# Altium schematic symbol library Regulator_Linear.SchLib: 1452 symbols (part 7 of 10)
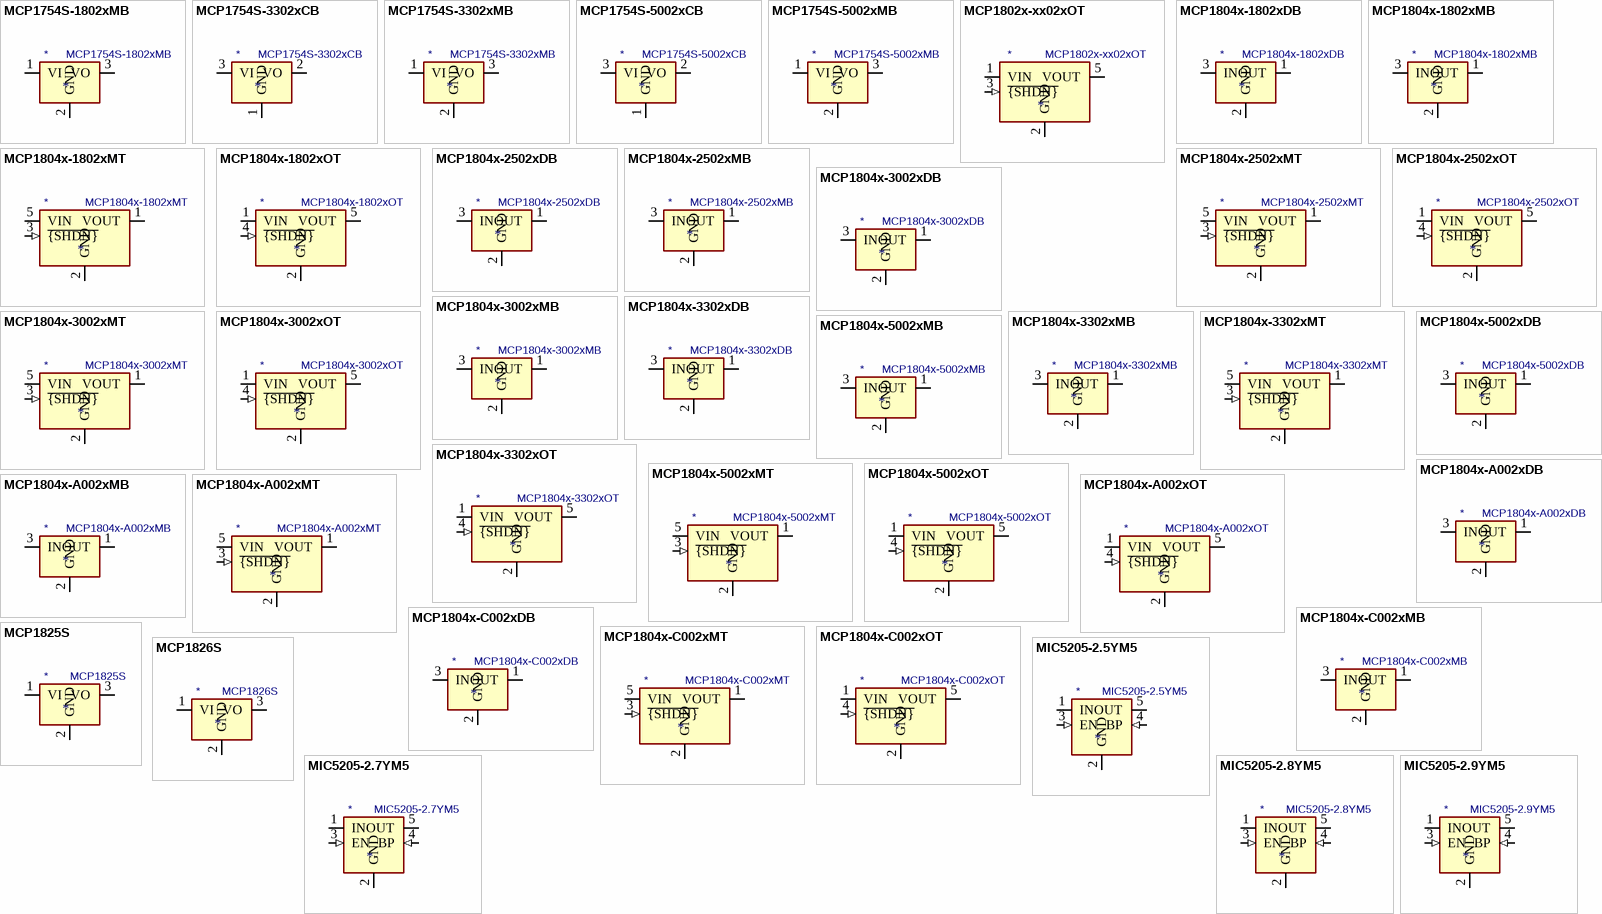
[diagram p42: symbols MCP1754S-1802xMB to MIC5205-2.9YM5]

## MCP1804x-5002xMT
designator *  value MCP1804x-5002xMT
ki_keywords: linear regulator ldo fixed positive; ki_description: 150mA, 28V LDO Regulator With Shutdown, 5.0V Fixed Output, SOT-89-5; ki_fp_filters: SOT?89*; Footprint: Package_TO_SOT_SMD:SOT-89-5; Supplier: http://ww1.microchip.com/downloads/en/DeviceDoc/20002200D.pdf
footprint SOT-89-5
pins: 1 VOUT (power), 2 GND (power), 3 ~{{SHDN}} (in), 4 NC (in) hidden, 5 VIN (power)

## MCP1804x-5002xOT
designator *  value MCP1804x-5002xOT
ki_keywords: linear regulator ldo fixed positive; ki_description: 150mA, 28V LDO Regulator With Shutdown, 5.0V Fixed Output, SOT-23-5; ki_fp_filters: SOT?23*; Footprint: Package_TO_SOT_SMD:SOT-23-5; Supplier: http://ww1.microchip.com/downloads/en/DeviceDoc/20002200D.pdf
footprint SOT-23-5
pins: 1 VIN (power), 2 GND (power), 3 NC (in) hidden, 4 ~{{SHDN}} (in), 5 VOUT (power)

## MCP1804x-A002xDB
designator *  value MCP1804x-A002xDB
ki_keywords: linear regulator ldo fixed positive; ki_description: 150mA, 28V LDO Regulator With Shutdown, 10.0V Fixed Output, SOT-223; ki_fp_filters: SOT?223*; Footprint: Package_TO_SOT_SMD:SOT-223-3_TabPin2; Supplier: http://ww1.microchip.com/downloads/en/DeviceDoc/20002200D.pdf
footprint SOT-223-3_TabPin2
pins: 1 OUT (power), 2 GND (power), 3 IN (power)

## MCP1804x-A002xMB
designator *  value MCP1804x-A002xMB
ki_keywords: linear regulator ldo fixed positive; ki_description: 150mA, 28V LDO Regulator With Shutdown, 10.0V Fixed Output, SOT-89-3; ki_fp_filters: SOT?89*; Footprint: Package_TO_SOT_SMD:SOT-89-3; Supplier: http://ww1.microchip.com/downloads/en/DeviceDoc/20002200D.pdf
footprint SOT-89-3
pins: 1 OUT (power), 2 GND (power), 3 IN (power)

## MCP1804x-A002xMT
designator *  value MCP1804x-A002xMT
ki_keywords: linear regulator ldo fixed positive; ki_description: 150mA, 28V LDO Regulator With Shutdown, 10.0V Fixed Output, SOT-89-5; ki_fp_filters: SOT?89*; Footprint: Package_TO_SOT_SMD:SOT-89-5; Supplier: http://ww1.microchip.com/downloads/en/DeviceDoc/20002200D.pdf
footprint SOT-89-5
pins: 1 VOUT (power), 2 GND (power), 3 ~{{SHDN}} (in), 4 NC (in) hidden, 5 VIN (power)

## MCP1804x-A002xOT
designator *  value MCP1804x-A002xOT
ki_keywords: linear regulator ldo fixed positive; ki_description: 150mA, 28V LDO Regulator With Shutdown, 10.0V Fixed Output, SOT-23-5; ki_fp_filters: SOT?23*; Footprint: Package_TO_SOT_SMD:SOT-23-5; Supplier: http://ww1.microchip.com/downloads/en/DeviceDoc/20002200D.pdf
footprint SOT-23-5
pins: 1 VIN (power), 2 GND (power), 3 NC (in) hidden, 4 ~{{SHDN}} (in), 5 VOUT (power)

## MCP1804x-C002xDB
designator *  value MCP1804x-C002xDB
ki_keywords: linear regulator ldo fixed positive; ki_description: 150mA, 28V LDO Regulator With Shutdown, 12.0V Fixed Output, SOT-223; ki_fp_filters: SOT?223*; Footprint: Package_TO_SOT_SMD:SOT-223-3_TabPin2; Supplier: http://ww1.microchip.com/downloads/en/DeviceDoc/20002200D.pdf
footprint SOT-223-3_TabPin2
pins: 1 OUT (power), 2 GND (power), 3 IN (power)

## MCP1804x-C002xMB
designator *  value MCP1804x-C002xMB
ki_keywords: linear regulator ldo fixed positive; ki_description: 150mA, 28V LDO Regulator With Shutdown, 12.0V Fixed Output, SOT-89-3; ki_fp_filters: SOT?89*; Footprint: Package_TO_SOT_SMD:SOT-89-3; Supplier: http://ww1.microchip.com/downloads/en/DeviceDoc/20002200D.pdf
footprint SOT-89-3
pins: 1 OUT (power), 2 GND (power), 3 IN (power)

## MCP1804x-C002xMT
designator *  value MCP1804x-C002xMT
ki_keywords: linear regulator ldo fixed positive; ki_description: 150mA, 28V LDO Regulator With Shutdown, 12.0V Fixed Output, SOT-89-5; ki_fp_filters: SOT?89*; Footprint: Package_TO_SOT_SMD:SOT-89-5; Supplier: http://ww1.microchip.com/downloads/en/DeviceDoc/20002200D.pdf
footprint SOT-89-5
pins: 1 VOUT (power), 2 GND (power), 3 ~{{SHDN}} (in), 4 NC (in) hidden, 5 VIN (power)

## MCP1804x-C002xOT
designator *  value MCP1804x-C002xOT
ki_keywords: linear regulator ldo fixed positive; ki_description: 150mA, 28V LDO Regulator With Shutdown, 12.0V Fixed Output, SOT-23-5; ki_fp_filters: SOT?23*; Footprint: Package_TO_SOT_SMD:SOT-23-5; Supplier: http://ww1.microchip.com/downloads/en/DeviceDoc/20002200D.pdf
footprint SOT-23-5
pins: 1 VIN (power), 2 GND (power), 3 NC (in) hidden, 4 ~{{SHDN}} (in), 5 VOUT (power)

## MCP1825S
designator *  value MCP1825S
ki_keywords: regulator linear ldo; ki_description: 500mA, Low-Voltage, Low Quiescent Current LDO Regulator, SOT-223, TO-220, TO-263; ki_fp_filters: SOT?223*TabPin2* TO?220* TO?263*; Supplier: http://ww1.microchip.com/downloads/en/devicedoc/22056b.pdf
pins: 1 VI (power), 2 GND (power), 3 VO (power)

## MCP1826S
designator *  value MCP1826S
ki_keywords: regulator linear ldo; ki_description: 1000mA, Low-Voltage, Low Quiescent Current LDO Regulator, SOT-223, TO-220, TO-263; ki_fp_filters: SOT?223*TabPin2* TO?220* TO?263*; Supplier: http://ww1.microchip.com/downloads/en/DeviceDoc/22057B.pdf
pins: 1 VI (power), 2 GND (power), 3 VO (power)

## MIC5205-2.5YM5
designator *  value MIC5205-2.5YM5
ki_keywords: 150mA low-noise LDO linear voltage regulator fixed positive; ki_description: 150mA low dropout linear regulator, fixed 2.5V output, SOT-23-5; ki_fp_filters: SOT?23*; Footprint: Package_TO_SOT_SMD:SOT-23-5; Supplier: http://ww1.microchip.com/downloads/en/DeviceDoc/20005785A.pdf
footprint SOT-23-5
pins: 1 IN (power), 2 GND (power), 3 EN (in), 4 BP (in), 5 OUT (power)

## MIC5205-2.7YM5
designator *  value MIC5205-2.7YM5
ki_keywords: 150mA low-noise LDO linear voltage regulator fixed positive; ki_description: 150mA low dropout linear regulator, fixed 2.7V output, SOT-23-5; ki_fp_filters: SOT?23*; Footprint: Package_TO_SOT_SMD:SOT-23-5; Supplier: http://ww1.microchip.com/downloads/en/DeviceDoc/20005785A.pdf
footprint SOT-23-5
pins: 1 IN (power), 2 GND (power), 3 EN (in), 4 BP (in), 5 OUT (power)

## MIC5205-2.8YM5
designator *  value MIC5205-2.8YM5
ki_keywords: 150mA low-noise LDO linear voltage regulator fixed positive; ki_description: 150mA low dropout linear regulator, fixed 2.8V output, SOT-23-5; ki_fp_filters: SOT?23*; Footprint: Package_TO_SOT_SMD:SOT-23-5; Supplier: http://ww1.microchip.com/downloads/en/DeviceDoc/20005785A.pdf
footprint SOT-23-5
pins: 1 IN (power), 2 GND (power), 3 EN (in), 4 BP (in), 5 OUT (power)

## MIC5205-2.9YM5
designator *  value MIC5205-2.9YM5
ki_keywords: 150mA low-noise LDO linear voltage regulator fixed positive; ki_description: 150mA low dropout linear regulator, fixed 2.9V output, SOT-23-5; ki_fp_filters: SOT?23*; Footprint: Package_TO_SOT_SMD:SOT-23-5; Supplier: http://ww1.microchip.com/downloads/en/DeviceDoc/20005785A.pdf
footprint SOT-23-5
pins: 1 IN (power), 2 GND (power), 3 EN (in), 4 BP (in), 5 OUT (power)

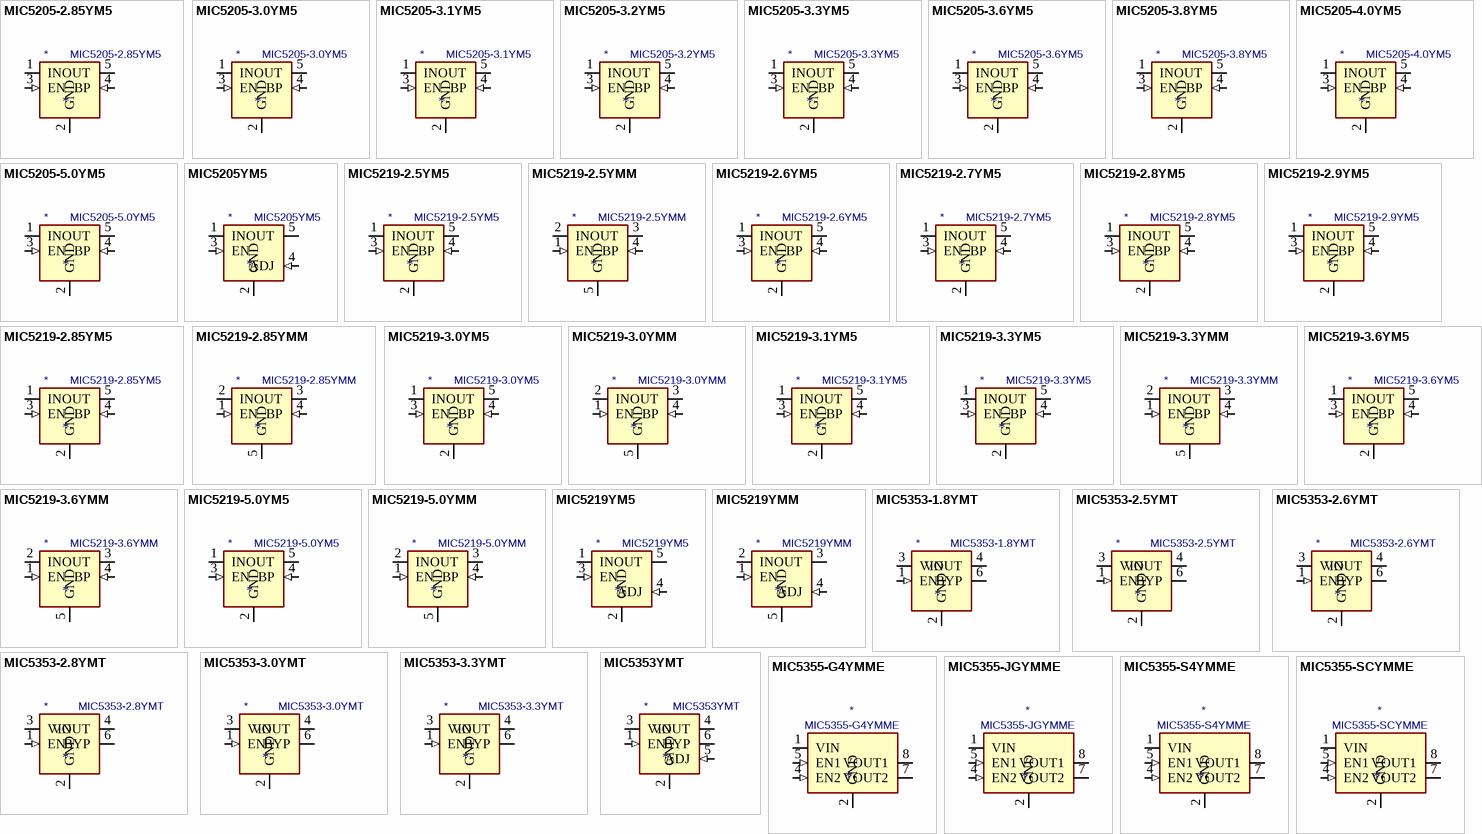
[diagram p24: symbols MIC5205-2.85YM5 to MIC5355-SCYMME]

## MIC5205-2.85YM5
designator *  value MIC5205-2.85YM5
ki_keywords: 150mA low-noise LDO linear voltage regulator fixed positive; ki_description: 150mA low dropout linear regulator, fixed 2.85V output, SOT-23-5; ki_fp_filters: SOT?23*; Footprint: Package_TO_SOT_SMD:SOT-23-5; Supplier: http://ww1.microchip.com/downloads/en/DeviceDoc/20005785A.pdf
footprint SOT-23-5
pins: 1 IN (power), 2 GND (power), 3 EN (in), 4 BP (in), 5 OUT (power)

## MIC5205-3.0YM5
designator *  value MIC5205-3.0YM5
ki_keywords: 150mA low-noise LDO linear voltage regulator fixed positive; ki_description: 150mA low dropout linear regulator, fixed 3.0V output, SOT-23-5; ki_fp_filters: SOT?23*; Footprint: Package_TO_SOT_SMD:SOT-23-5; Supplier: http://ww1.microchip.com/downloads/en/DeviceDoc/20005785A.pdf
footprint SOT-23-5
pins: 1 IN (power), 2 GND (power), 3 EN (in), 4 BP (in), 5 OUT (power)

## MIC5205-3.1YM5
designator *  value MIC5205-3.1YM5
ki_keywords: 150mA low-noise LDO linear voltage regulator fixed positive; ki_description: 150mA low dropout linear regulator, fixed 3.1V output, SOT-23-5; ki_fp_filters: SOT?23*; Footprint: Package_TO_SOT_SMD:SOT-23-5; Supplier: http://ww1.microchip.com/downloads/en/DeviceDoc/20005785A.pdf
footprint SOT-23-5
pins: 1 IN (power), 2 GND (power), 3 EN (in), 4 BP (in), 5 OUT (power)

## MIC5205-3.2YM5
designator *  value MIC5205-3.2YM5
ki_keywords: 150mA low-noise LDO linear voltage regulator fixed positive; ki_description: 150mA low dropout linear regulator, fixed 3.2V output, SOT-23-5; ki_fp_filters: SOT?23*; Footprint: Package_TO_SOT_SMD:SOT-23-5; Supplier: http://ww1.microchip.com/downloads/en/DeviceDoc/20005785A.pdf
footprint SOT-23-5
pins: 1 IN (power), 2 GND (power), 3 EN (in), 4 BP (in), 5 OUT (power)

## MIC5205-3.3YM5
designator *  value MIC5205-3.3YM5
ki_keywords: 150mA low-noise LDO linear voltage regulator fixed positive; ki_description: 150mA low dropout linear regulator, fixed 3.3V output, SOT-23-5; ki_fp_filters: SOT?23*; Footprint: Package_TO_SOT_SMD:SOT-23-5; Supplier: http://ww1.microchip.com/downloads/en/DeviceDoc/20005785A.pdf
footprint SOT-23-5
pins: 1 IN (power), 2 GND (power), 3 EN (in), 4 BP (in), 5 OUT (power)

## MIC5205-3.6YM5
designator *  value MIC5205-3.6YM5
ki_keywords: 150mA low-noise LDO linear voltage regulator fixed positive; ki_description: 150mA low dropout linear regulator, fixed 3.6V output, SOT-23-5; ki_fp_filters: SOT?23*; Footprint: Package_TO_SOT_SMD:SOT-23-5; Supplier: http://ww1.microchip.com/downloads/en/DeviceDoc/20005785A.pdf
footprint SOT-23-5
pins: 1 IN (power), 2 GND (power), 3 EN (in), 4 BP (in), 5 OUT (power)

## MIC5205-3.8YM5
designator *  value MIC5205-3.8YM5
ki_keywords: 150mA low-noise LDO linear voltage regulator fixed positive; ki_description: 150mA low dropout linear regulator, fixed 3.8V output, SOT-23-5; ki_fp_filters: SOT?23*; Footprint: Package_TO_SOT_SMD:SOT-23-5; Supplier: http://ww1.microchip.com/downloads/en/DeviceDoc/20005785A.pdf
footprint SOT-23-5
pins: 1 IN (power), 2 GND (power), 3 EN (in), 4 BP (in), 5 OUT (power)

## MIC5205-4.0YM5
designator *  value MIC5205-4.0YM5
ki_keywords: 150mA low-noise LDO linear voltage regulator fixed positive; ki_description: 150mA low dropout linear regulator, fixed 4.0V output, SOT-23-5; ki_fp_filters: SOT?23*; Footprint: Package_TO_SOT_SMD:SOT-23-5; Supplier: http://ww1.microchip.com/downloads/en/DeviceDoc/20005785A.pdf
footprint SOT-23-5
pins: 1 IN (power), 2 GND (power), 3 EN (in), 4 BP (in), 5 OUT (power)

## MIC5205-5.0YM5
designator *  value MIC5205-5.0YM5
ki_keywords: 150mA low-noise LDO linear voltage regulator fixed positive; ki_description: 150mA low dropout linear regulator, fixed 5.0V output, SOT-23-5; ki_fp_filters: SOT?23*; Footprint: Package_TO_SOT_SMD:SOT-23-5; Supplier: http://ww1.microchip.com/downloads/en/DeviceDoc/20005785A.pdf
footprint SOT-23-5
pins: 1 IN (power), 2 GND (power), 3 EN (in), 4 BP (in), 5 OUT (power)

## MIC5205YM5
designator *  value MIC5205YM5
ki_keywords: 150mA low-noise LDO linear voltage regulator adjustable positive; ki_description: 150mA low dropout linear regulator, adjustable output, SOT-23-5; ki_fp_filters: SOT?23*; Footprint: Package_TO_SOT_SMD:SOT-23-5; Supplier: http://ww1.microchip.com/downloads/en/DeviceDoc/20005785A.pdf
footprint SOT-23-5
pins: 1 IN (power), 2 GND (power), 3 EN (in), 4 ADJ (in), 5 OUT (power)

## MIC5219-2.5YM5
designator *  value MIC5219-2.5YM5
ki_keywords: 500mA ultra-low-noise LDO linear voltage regulator fixed positive; ki_description: 500mA low dropout linear regulator, fixed 2.5V output, SOT-23-5; ki_fp_filters: SOT?23*; Footprint: Package_TO_SOT_SMD:SOT-23-5; Supplier: http://ww1.microchip.com/downloads/en/DeviceDoc/MIC5219-500mA-Peak-Output-LDO-Regulator-DS20006021A.pdf
footprint SOT-23-5
pins: 1 IN (power), 2 GND (power), 3 EN (in), 4 BP (in), 5 OUT (power)

## MIC5219-2.5YMM
designator *  value MIC5219-2.5YMM
ki_keywords: 500mA ultra-low-noise LDO linear voltage regulator fixed positive; ki_description: 500mA low dropout linear regulator, fixed 2.5V output, MSOP-8; ki_fp_filters: MSOP*3x3mm*P0.65mm*; Footprint: Package_SO:MSOP-8_3x3mm_P0.65mm; Supplier: http://ww1.microchip.com/downloads/en/DeviceDoc/MIC5219-500mA-Peak-Output-LDO-Regulator-DS20006021A.pdf
footprint MSOP-8_3x3mm_P0.65mm
pins: 1 EN (in), 2 IN (power), 3 OUT (power), 4 BP (in), 5 GND (power), 6 GND hidden, 7 GND hidden, 8 GND hidden

## MIC5219-2.6YM5
designator *  value MIC5219-2.6YM5
ki_keywords: 500mA ultra-low-noise LDO linear voltage regulator fixed positive; ki_description: 500mA low dropout linear regulator, fixed 2.6V output, SOT-23-5; ki_fp_filters: SOT?23*; Footprint: Package_TO_SOT_SMD:SOT-23-5; Supplier: http://ww1.microchip.com/downloads/en/DeviceDoc/MIC5219-500mA-Peak-Output-LDO-Regulator-DS20006021A.pdf
footprint SOT-23-5
pins: 1 IN (power), 2 GND (power), 3 EN (in), 4 BP (in), 5 OUT (power)

## MIC5219-2.7YM5
designator *  value MIC5219-2.7YM5
ki_keywords: 500mA ultra-low-noise LDO linear voltage regulator fixed positive; ki_description: 500mA low dropout linear regulator, fixed 2.7V output, SOT-23-5; ki_fp_filters: SOT?23*; Footprint: Package_TO_SOT_SMD:SOT-23-5; Supplier: http://ww1.microchip.com/downloads/en/DeviceDoc/MIC5219-500mA-Peak-Output-LDO-Regulator-DS20006021A.pdf
footprint SOT-23-5
pins: 1 IN (power), 2 GND (power), 3 EN (in), 4 BP (in), 5 OUT (power)

## MIC5219-2.8YM5
designator *  value MIC5219-2.8YM5
ki_keywords: 500mA ultra-low-noise LDO linear voltage regulator fixed positive; ki_description: 500mA low dropout linear regulator, fixed 2.8V output, SOT-23-5; ki_fp_filters: SOT?23*; Footprint: Package_TO_SOT_SMD:SOT-23-5; Supplier: http://ww1.microchip.com/downloads/en/DeviceDoc/MIC5219-500mA-Peak-Output-LDO-Regulator-DS20006021A.pdf
footprint SOT-23-5
pins: 1 IN (power), 2 GND (power), 3 EN (in), 4 BP (in), 5 OUT (power)

## MIC5219-2.9YM5
designator *  value MIC5219-2.9YM5
ki_keywords: 500mA ultra-low-noise LDO linear voltage regulator fixed positive; ki_description: 500mA low dropout linear regulator, fixed 2.9V output, SOT-23-5; ki_fp_filters: SOT?23*; Footprint: Package_TO_SOT_SMD:SOT-23-5; Supplier: http://ww1.microchip.com/downloads/en/DeviceDoc/MIC5219-500mA-Peak-Output-LDO-Regulator-DS20006021A.pdf
footprint SOT-23-5
pins: 1 IN (power), 2 GND (power), 3 EN (in), 4 BP (in), 5 OUT (power)

## MIC5219-2.85YM5
designator *  value MIC5219-2.85YM5
ki_keywords: 500mA ultra-low-noise LDO linear voltage regulator fixed positive; ki_description: 500mA low dropout linear regulator, fixed 2.85V output, SOT-23-5; ki_fp_filters: SOT?23*; Footprint: Package_TO_SOT_SMD:SOT-23-5; Supplier: http://ww1.microchip.com/downloads/en/DeviceDoc/MIC5219-500mA-Peak-Output-LDO-Regulator-DS20006021A.pdf
footprint SOT-23-5
pins: 1 IN (power), 2 GND (power), 3 EN (in), 4 BP (in), 5 OUT (power)

## MIC5219-2.85YMM
designator *  value MIC5219-2.85YMM
ki_keywords: 500mA ultra-low-noise LDO linear voltage regulator fixed positive; ki_description: 500mA low dropout linear regulator, fixed 2.85V output, MSOP-8; ki_fp_filters: MSOP*3x3mm*P0.65mm*; Footprint: Package_SO:MSOP-8_3x3mm_P0.65mm; Supplier: http://ww1.microchip.com/downloads/en/DeviceDoc/MIC5219-500mA-Peak-Output-LDO-Regulator-DS20006021A.pdf
footprint MSOP-8_3x3mm_P0.65mm
pins: 1 EN (in), 2 IN (power), 3 OUT (power), 4 BP (in), 5 GND (power), 6 GND hidden, 7 GND hidden, 8 GND hidden

## MIC5219-3.0YM5
designator *  value MIC5219-3.0YM5
ki_keywords: 500mA ultra-low-noise LDO linear voltage regulator fixed positive; ki_description: 500mA low dropout linear regulator, fixed 3.0V output, SOT-23-5; ki_fp_filters: SOT?23*; Footprint: Package_TO_SOT_SMD:SOT-23-5; Supplier: http://ww1.microchip.com/downloads/en/DeviceDoc/MIC5219-500mA-Peak-Output-LDO-Regulator-DS20006021A.pdf
footprint SOT-23-5
pins: 1 IN (power), 2 GND (power), 3 EN (in), 4 BP (in), 5 OUT (power)

## MIC5219-3.0YMM
designator *  value MIC5219-3.0YMM
ki_keywords: 500mA ultra-low-noise LDO linear voltage regulator fixed positive; ki_description: 500mA low dropout linear regulator, fixed 3.0V output, MSOP-8; ki_fp_filters: MSOP*3x3mm*P0.65mm*; Footprint: Package_SO:MSOP-8_3x3mm_P0.65mm; Supplier: http://ww1.microchip.com/downloads/en/DeviceDoc/MIC5219-500mA-Peak-Output-LDO-Regulator-DS20006021A.pdf
footprint MSOP-8_3x3mm_P0.65mm
pins: 1 EN (in), 2 IN (power), 3 OUT (power), 4 BP (in), 5 GND (power), 6 GND hidden, 7 GND hidden, 8 GND hidden

## MIC5219-3.1YM5
designator *  value MIC5219-3.1YM5
ki_keywords: 500mA ultra-low-noise LDO linear voltage regulator fixed positive; ki_description: 500mA low dropout linear regulator, fixed 3.1V output, SOT-23-5; ki_fp_filters: SOT?23*; Footprint: Package_TO_SOT_SMD:SOT-23-5; Supplier: http://ww1.microchip.com/downloads/en/DeviceDoc/MIC5219-500mA-Peak-Output-LDO-Regulator-DS20006021A.pdf
footprint SOT-23-5
pins: 1 IN (power), 2 GND (power), 3 EN (in), 4 BP (in), 5 OUT (power)

## MIC5219-3.3YM5
designator *  value MIC5219-3.3YM5
ki_keywords: 500mA ultra-low-noise LDO linear voltage regulator fixed positive; ki_description: 500mA low dropout linear regulator, fixed 3.3V output, SOT-23-5; ki_fp_filters: SOT?23*; Footprint: Package_TO_SOT_SMD:SOT-23-5; Supplier: http://ww1.microchip.com/downloads/en/DeviceDoc/MIC5219-500mA-Peak-Output-LDO-Regulator-DS20006021A.pdf
footprint SOT-23-5
pins: 1 IN (power), 2 GND (power), 3 EN (in), 4 BP (in), 5 OUT (power)

## MIC5219-3.3YMM
designator *  value MIC5219-3.3YMM
ki_keywords: 500mA ultra-low-noise LDO linear voltage regulator fixed positive; ki_description: 500mA low dropout linear regulator, fixed 3.3V output, MSOP-8; ki_fp_filters: MSOP*3x3mm*P0.65mm*; Footprint: Package_SO:MSOP-8_3x3mm_P0.65mm; Supplier: http://ww1.microchip.com/downloads/en/DeviceDoc/MIC5219-500mA-Peak-Output-LDO-Regulator-DS20006021A.pdf
footprint MSOP-8_3x3mm_P0.65mm
pins: 1 EN (in), 2 IN (power), 3 OUT (power), 4 BP (in), 5 GND (power), 6 GND hidden, 7 GND hidden, 8 GND hidden

## MIC5219-3.6YM5
designator *  value MIC5219-3.6YM5
ki_keywords: 500mA ultra-low-noise LDO linear voltage regulator fixed positive; ki_description: 500mA low dropout linear regulator, fixed 3.6V output, SOT-23-5; ki_fp_filters: SOT?23*; Footprint: Package_TO_SOT_SMD:SOT-23-5; Supplier: http://ww1.microchip.com/downloads/en/DeviceDoc/MIC5219-500mA-Peak-Output-LDO-Regulator-DS20006021A.pdf
footprint SOT-23-5
pins: 1 IN (power), 2 GND (power), 3 EN (in), 4 BP (in), 5 OUT (power)

## MIC5219-3.6YMM
designator *  value MIC5219-3.6YMM
ki_keywords: 500mA ultra-low-noise LDO linear voltage regulator fixed positive; ki_description: 500mA low dropout linear regulator, fixed 3.6V output, MSOP-8; ki_fp_filters: MSOP*3x3mm*P0.65mm*; Footprint: Package_SO:MSOP-8_3x3mm_P0.65mm; Supplier: http://ww1.microchip.com/downloads/en/DeviceDoc/MIC5219-500mA-Peak-Output-LDO-Regulator-DS20006021A.pdf
footprint MSOP-8_3x3mm_P0.65mm
pins: 1 EN (in), 2 IN (power), 3 OUT (power), 4 BP (in), 5 GND (power), 6 GND hidden, 7 GND hidden, 8 GND hidden

## MIC5219-5.0YM5
designator *  value MIC5219-5.0YM5
ki_keywords: 500mA ultra-low-noise LDO linear voltage regulator fixed positive; ki_description: 500mA low dropout linear regulator, fixed 5.0V output, SOT-23-5; ki_fp_filters: SOT?23*; Footprint: Package_TO_SOT_SMD:SOT-23-5; Supplier: http://ww1.microchip.com/downloads/en/DeviceDoc/MIC5219-500mA-Peak-Output-LDO-Regulator-DS20006021A.pdf
footprint SOT-23-5
pins: 1 IN (power), 2 GND (power), 3 EN (in), 4 BP (in), 5 OUT (power)

## MIC5219-5.0YMM
designator *  value MIC5219-5.0YMM
ki_keywords: 500mA ultra-low-noise LDO linear voltage regulator fixed positive; ki_description: 500mA low dropout linear regulator, fixed 5.0V output, MSOP-8; ki_fp_filters: MSOP*3x3mm*P0.65mm*; Footprint: Package_SO:MSOP-8_3x3mm_P0.65mm; Supplier: http://ww1.microchip.com/downloads/en/DeviceDoc/MIC5219-500mA-Peak-Output-LDO-Regulator-DS20006021A.pdf
footprint MSOP-8_3x3mm_P0.65mm
pins: 1 EN (in), 2 IN (power), 3 OUT (power), 4 BP (in), 5 GND (power), 6 GND hidden, 7 GND hidden, 8 GND hidden

## MIC5219YM5
designator *  value MIC5219YM5
ki_keywords: 500mA ultra-low-noise LDO linear voltage regulator adjustable positive; ki_description: 500mA low dropout linear regulator, adjustable output, SOT-23-5; ki_fp_filters: SOT?23*; Footprint: Package_TO_SOT_SMD:SOT-23-5; Supplier: http://ww1.microchip.com/downloads/en/DeviceDoc/MIC5219-500mA-Peak-Output-LDO-Regulator-DS20006021A.pdf
footprint SOT-23-5
pins: 1 IN (power), 2 GND (power), 3 EN (in), 4 ADJ (in), 5 OUT (power)

## MIC5219YMM
designator *  value MIC5219YMM
ki_keywords: 500mA ultra-low-noise LDO linear voltage regulator adjustable positive; ki_description: 500mA low dropout linear regulator, adjustable output, MSOP-8; ki_fp_filters: MSOP*3x3mm*P0.65mm*; Footprint: Package_SO:MSOP-8_3x3mm_P0.65mm; Supplier: http://ww1.microchip.com/downloads/en/DeviceDoc/MIC5219-500mA-Peak-Output-LDO-Regulator-DS20006021A.pdf
footprint MSOP-8_3x3mm_P0.65mm
pins: 1 EN (in), 2 IN (power), 3 OUT (power), 4 ADJ (in), 5 GND (power), 6 GND hidden, 7 GND hidden, 8 GND hidden

## MIC5353-1.8YMT
designator *  value MIC5353-1.8YMT
ki_keywords: Single LDO; ki_description: High-performance, single-output,  ultra-low  LDO regulator; ki_fp_filters: MLF?6?1EP*1.6x1.6mm*P0.5mm*; Footprint: Package_DFN_QFN:MLF-6-1EP_1.6x1.6mm_P0.5mm_EP0.5x1.26mm; Supplier: http://ww1.microchip.com/downloads/en/DeviceDoc/mic5353.pdf
footprint MLF-6-1EP_1.6x1.6mm_P0.5mm_EP0.5x1.26mm
pins: 1 EN (in), 2 GND (power), 3 VIN (power), 4 VOUT (power), 5 NC (in) hidden, 6 BYP, 7 GND hidden

## MIC5353-2.5YMT
designator *  value MIC5353-2.5YMT
ki_keywords: Single LDO; ki_description: High-performance, single-output,  ultra-low  LDO regulator; ki_fp_filters: MLF?6?1EP*1.6x1.6mm*P0.5mm*; Footprint: Package_DFN_QFN:MLF-6-1EP_1.6x1.6mm_P0.5mm_EP0.5x1.26mm; Supplier: http://ww1.microchip.com/downloads/en/DeviceDoc/mic5353.pdf
footprint MLF-6-1EP_1.6x1.6mm_P0.5mm_EP0.5x1.26mm
pins: 1 EN (in), 2 GND (power), 3 VIN (power), 4 VOUT (power), 5 NC (in) hidden, 6 BYP, 7 GND hidden

## MIC5353-2.6YMT
designator *  value MIC5353-2.6YMT
ki_keywords: Single LDO; ki_description: High-performance, single-output,  ultra-low  LDO regulator; ki_fp_filters: MLF?6?1EP*1.6x1.6mm*P0.5mm*; Footprint: Package_DFN_QFN:MLF-6-1EP_1.6x1.6mm_P0.5mm_EP0.5x1.26mm; Supplier: http://ww1.microchip.com/downloads/en/DeviceDoc/mic5353.pdf
footprint MLF-6-1EP_1.6x1.6mm_P0.5mm_EP0.5x1.26mm
pins: 1 EN (in), 2 GND (power), 3 VIN (power), 4 VOUT (power), 5 NC (in) hidden, 6 BYP, 7 GND hidden

## MIC5353-2.8YMT
designator *  value MIC5353-2.8YMT
ki_keywords: Single LDO; ki_description: High-performance, single-output,  ultra-low  LDO regulator; ki_fp_filters: MLF?6?1EP*1.6x1.6mm*P0.5mm*; Footprint: Package_DFN_QFN:MLF-6-1EP_1.6x1.6mm_P0.5mm_EP0.5x1.26mm; Supplier: http://ww1.microchip.com/downloads/en/DeviceDoc/mic5353.pdf
footprint MLF-6-1EP_1.6x1.6mm_P0.5mm_EP0.5x1.26mm
pins: 1 EN (in), 2 GND (power), 3 VIN (power), 4 VOUT (power), 5 NC (in) hidden, 6 BYP, 7 GND hidden

## MIC5353-3.0YMT
designator *  value MIC5353-3.0YMT
ki_keywords: Single LDO; ki_description: High-performance, single-output,  ultra-low  LDO regulator; ki_fp_filters: MLF?6?1EP*1.6x1.6mm*P0.5mm*; Footprint: Package_DFN_QFN:MLF-6-1EP_1.6x1.6mm_P0.5mm_EP0.5x1.26mm; Supplier: http://ww1.microchip.com/downloads/en/DeviceDoc/mic5353.pdf
footprint MLF-6-1EP_1.6x1.6mm_P0.5mm_EP0.5x1.26mm
pins: 1 EN (in), 2 GND (power), 3 VIN (power), 4 VOUT (power), 5 NC (in) hidden, 6 BYP, 7 GND hidden

## MIC5353-3.3YMT
designator *  value MIC5353-3.3YMT
ki_keywords: Single LDO; ki_description: High-performance, single-output,  ultra-low  LDO regulator; ki_fp_filters: MLF?6?1EP*1.6x1.6mm*P0.5mm*; Footprint: Package_DFN_QFN:MLF-6-1EP_1.6x1.6mm_P0.5mm_EP0.5x1.26mm; Supplier: http://ww1.microchip.com/downloads/en/DeviceDoc/mic5353.pdf
footprint MLF-6-1EP_1.6x1.6mm_P0.5mm_EP0.5x1.26mm
pins: 1 EN (in), 2 GND (power), 3 VIN (power), 4 VOUT (power), 5 NC (in) hidden, 6 BYP, 7 GND hidden

## MIC5353YMT
designator *  value MIC5353YMT
ki_keywords: Single LDO; ki_description: High-performance, single-output,  ultra-low  LDO regulator; ki_fp_filters: MLF?6?1EP*1.6x1.6mm*P0.5mm*; Footprint: Package_DFN_QFN:MLF-6-1EP_1.6x1.6mm_P0.5mm_EP0.5x1.26mm; Supplier: http://ww1.microchip.com/downloads/en/DeviceDoc/mic5353.pdf
footprint MLF-6-1EP_1.6x1.6mm_P0.5mm_EP0.5x1.26mm
pins: 1 EN (in), 2 GND (power), 3 VIN (power), 4 VOUT (power), 5 ADJ (in), 6 BYP, 7 GND hidden

## MIC5355-G4YMME
designator *  value MIC5355-G4YMME
ki_keywords: Dual LDO 500mA MSOP-8; ki_description: Dual 500mA μCap Low Dropout Micropower Linear Regulator, 1.8V/1.2V, MSOP-8; ki_fp_filters: MSOP*1EP*3x3mm*P0.65mm*; Footprint: Package_SO:MSOP-8-1EP_3x3mm_P0.65mm_EP2.5x3mm_Mask1.73x2.36mm_ThermalVias; Supplier: http://ww1.microchip.com/downloads/en/DeviceDoc/mic5355_6.pdf
footprint MSOP-8-1EP_3x3mm_P0.65mm_EP2.5x3mm_Mask1.73x2.36mm_ThermalVias
pins: 1 VIN (power), 2 GND (power), 3 NC (in) hidden, 4 EN2 (in), 5 EN1 (in), 6 NC (in) hidden, 7 VOUT2 (power), 8 VOUT1 (power), 9 GND hidden

## MIC5355-JGYMME
designator *  value MIC5355-JGYMME
ki_keywords: Dual LDO 500mA MSOP-8; ki_description: Dual 500mA μCap Low Dropout Micropower Linear Regulator, 2.5V/1.8V, MSOP-8; ki_fp_filters: MSOP*1EP*3x3mm*P0.65mm*; Footprint: Package_SO:MSOP-8-1EP_3x3mm_P0.65mm_EP2.5x3mm_Mask1.73x2.36mm_ThermalVias; Supplier: http://ww1.microchip.com/downloads/en/DeviceDoc/mic5355_6.pdf
footprint MSOP-8-1EP_3x3mm_P0.65mm_EP2.5x3mm_Mask1.73x2.36mm_ThermalVias
pins: 1 VIN (power), 2 GND (power), 3 NC (in) hidden, 4 EN2 (in), 5 EN1 (in), 6 NC (in) hidden, 7 VOUT2 (power), 8 VOUT1 (power), 9 GND hidden

## MIC5355-S4YMME
designator *  value MIC5355-S4YMME
ki_keywords: Dual LDO 500mA MSOP-8; ki_description: Dual 500mA μCap Low Dropout Micropower Linear Regulator, 3.3V/1.2V, MSOP-8; ki_fp_filters: MSOP*1EP*3x3mm*P0.65mm*; Footprint: Package_SO:MSOP-8-1EP_3x3mm_P0.65mm_EP2.5x3mm_Mask1.73x2.36mm_ThermalVias; Supplier: http://ww1.microchip.com/downloads/en/DeviceDoc/mic5355_6.pdf
footprint MSOP-8-1EP_3x3mm_P0.65mm_EP2.5x3mm_Mask1.73x2.36mm_ThermalVias
pins: 1 VIN (power), 2 GND (power), 3 NC (in) hidden, 4 EN2 (in), 5 EN1 (in), 6 NC (in) hidden, 7 VOUT2 (power), 8 VOUT1 (power), 9 GND hidden

## MIC5355-SCYMME
designator *  value MIC5355-SCYMME
ki_keywords: Dual LDO 500mA MSOP-8; ki_description: Dual 500mA μCap Low Dropout Micropower Linear Regulator, 3.3V/1.0V, MSOP-8; ki_fp_filters: MSOP*1EP*3x3mm*P0.65mm*; Footprint: Package_SO:MSOP-8-1EP_3x3mm_P0.65mm_EP2.5x3mm_Mask1.73x2.36mm_ThermalVias; Supplier: http://ww1.microchip.com/downloads/en/DeviceDoc/mic5355_6.pdf
footprint MSOP-8-1EP_3x3mm_P0.65mm_EP2.5x3mm_Mask1.73x2.36mm_ThermalVias
pins: 1 VIN (power), 2 GND (power), 3 NC (in) hidden, 4 EN2 (in), 5 EN1 (in), 6 NC (in) hidden, 7 VOUT2 (power), 8 VOUT1 (power), 9 GND hidden

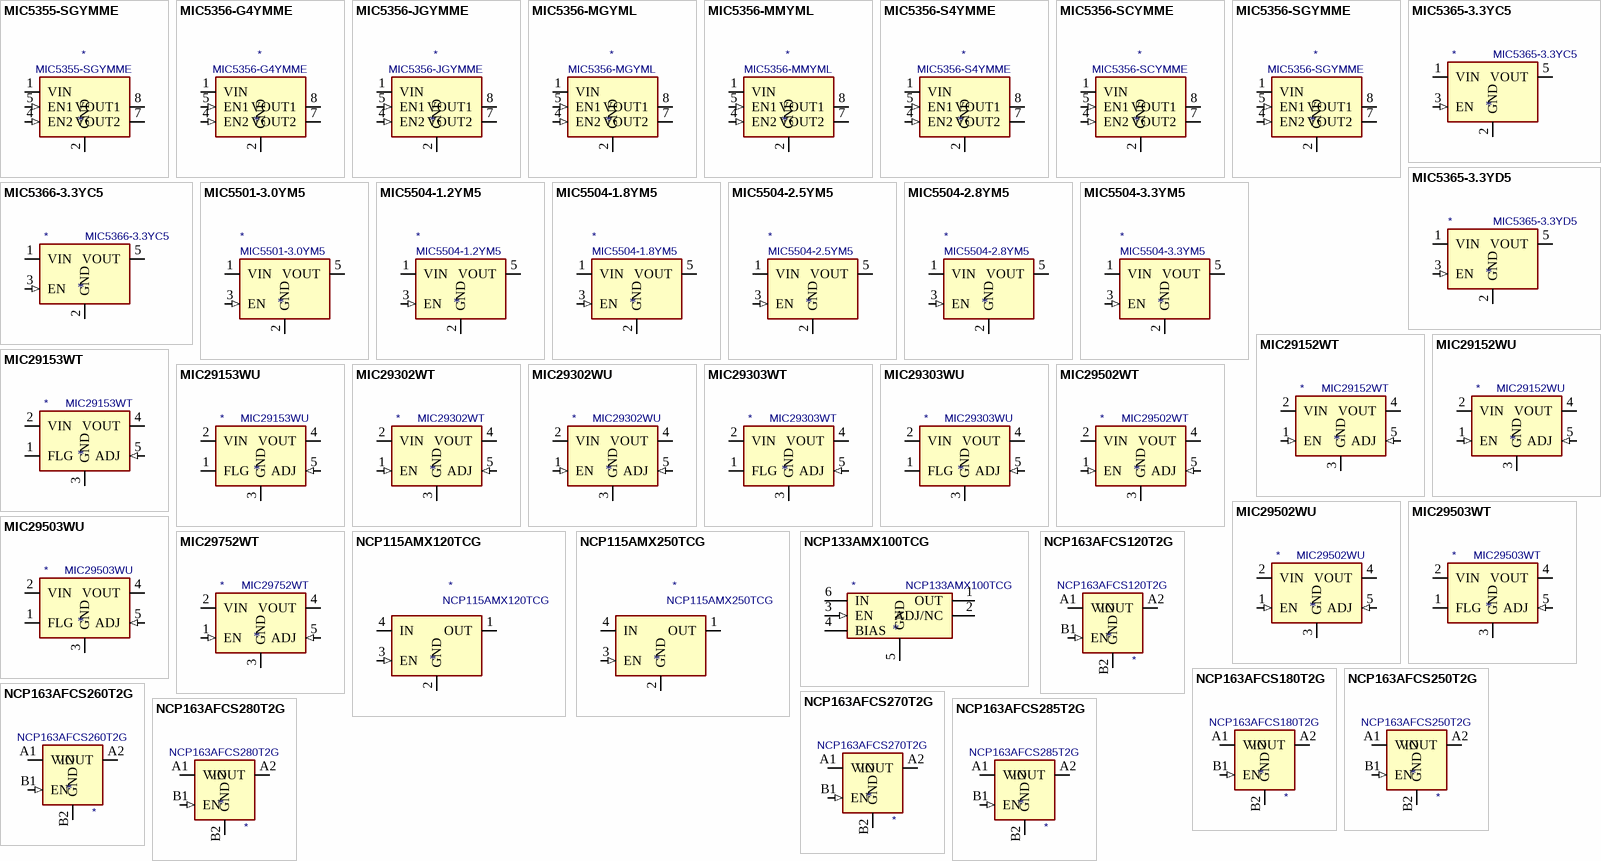
[diagram p25: symbols MIC5355-SGYMME to NCP163AFCS285T2G]

## MIC5355-SGYMME
designator *  value MIC5355-SGYMME
ki_keywords: Dual LDO 500mA MSOP-8; ki_description: Dual 500mA μCap Low Dropout Micropower Linear Regulator, 3.3V/1.8V, MSOP-8; ki_fp_filters: MSOP*1EP*3x3mm*P0.65mm*; Footprint: Package_SO:MSOP-8-1EP_3x3mm_P0.65mm_EP2.5x3mm_Mask1.73x2.36mm_ThermalVias; Supplier: http://ww1.microchip.com/downloads/en/DeviceDoc/mic5355_6.pdf
footprint MSOP-8-1EP_3x3mm_P0.65mm_EP2.5x3mm_Mask1.73x2.36mm_ThermalVias
pins: 1 VIN (power), 2 GND (power), 3 NC (in) hidden, 4 EN2 (in), 5 EN1 (in), 6 NC (in) hidden, 7 VOUT2 (power), 8 VOUT1 (power), 9 GND hidden

## MIC5356-G4YMME
designator *  value MIC5356-G4YMME
ki_keywords: Dual LDO 500mA MSOP-8; ki_description: Dual 500mA μCap Low Dropout Micropower Linear Regulator, 1.8V/1.2V, MSOP-8; ki_fp_filters: MSOP*1EP*3x3mm*P0.65mm*; Footprint: Package_SO:MSOP-8-1EP_3x3mm_P0.65mm_EP2.5x3mm_Mask1.73x2.36mm_ThermalVias; Supplier: http://ww1.microchip.com/downloads/en/DeviceDoc/mic5355_6.pdf
footprint MSOP-8-1EP_3x3mm_P0.65mm_EP2.5x3mm_Mask1.73x2.36mm_ThermalVias
pins: 1 VIN (power), 2 GND (power), 3 NC (in) hidden, 4 EN2 (in), 5 EN1 (in), 6 NC (in) hidden, 7 VOUT2 (power), 8 VOUT1 (power), 9 GND hidden

## MIC5356-JGYMME
designator *  value MIC5356-JGYMME
ki_keywords: Dual LDO 500mA MSOP-8; ki_description: Dual 500mA μCap Low Dropout Micropower Linear Regulator, 2.5V/1.8V, MSOP-8; ki_fp_filters: MSOP*1EP*3x3mm*P0.65mm*; Footprint: Package_SO:MSOP-8-1EP_3x3mm_P0.65mm_EP2.5x3mm_Mask1.73x2.36mm_ThermalVias; Supplier: http://ww1.microchip.com/downloads/en/DeviceDoc/mic5355_6.pdf
footprint MSOP-8-1EP_3x3mm_P0.65mm_EP2.5x3mm_Mask1.73x2.36mm_ThermalVias
pins: 1 VIN (power), 2 GND (power), 3 NC (in) hidden, 4 EN2 (in), 5 EN1 (in), 6 NC (in) hidden, 7 VOUT2 (power), 8 VOUT1 (power), 9 GND hidden

## MIC5356-MGYML
designator *  value MIC5356-MGYML
ki_keywords: Dual LDO 500mA DFN-8; ki_description: Dual 500mA μCap Low Dropout Micropower Linear Regulator, 2.8V/1.8V, DFN-8; ki_fp_filters: MLF*3x3mm*P0.65mm*EP1.55x2.3mm*; Footprint: Package_DFN_QFN:MLF-8-1EP_3x3mm_P0.65mm_EP1.55x2.3mm_ThermalVias; Supplier: http://ww1.microchip.com/downloads/en/DeviceDoc/mic5355_6.pdf
footprint MLF-8-1EP_3x3mm_P0.65mm_EP1.55x2.3mm_ThermalVias
pins: 1 VIN (power), 2 GND (power), 3 NC (in) hidden, 4 EN2 (in), 5 EN1 (in), 6 NC (in) hidden, 7 VOUT2 (power), 8 VOUT1 (power), 9 GND hidden

## MIC5356-MMYML
designator *  value MIC5356-MMYML
ki_keywords: Dual LDO 500mA DFN-8; ki_description: Dual 500mA μCap Low Dropout Micropower Linear Regulator, 2.8V/2.8V, DFN-8; ki_fp_filters: MLF*3x3mm*P0.65mm*EP1.55x2.3mm*; Footprint: Package_DFN_QFN:MLF-8-1EP_3x3mm_P0.65mm_EP1.55x2.3mm_ThermalVias; Supplier: http://ww1.microchip.com/downloads/en/DeviceDoc/mic5355_6.pdf
footprint MLF-8-1EP_3x3mm_P0.65mm_EP1.55x2.3mm_ThermalVias
pins: 1 VIN (power), 2 GND (power), 3 NC (in) hidden, 4 EN2 (in), 5 EN1 (in), 6 NC (in) hidden, 7 VOUT2 (power), 8 VOUT1 (power), 9 GND hidden

## MIC5356-S4YMME
designator *  value MIC5356-S4YMME
ki_keywords: Dual LDO 500mA MSOP-8; ki_description: Dual 500mA μCap Low Dropout Micropower Linear Regulator, 3.3V/1.2V, MSOP-8; ki_fp_filters: MSOP*1EP*3x3mm*P0.65mm*; Footprint: Package_SO:MSOP-8-1EP_3x3mm_P0.65mm_EP2.5x3mm_Mask1.73x2.36mm_ThermalVias; Supplier: http://ww1.microchip.com/downloads/en/DeviceDoc/mic5355_6.pdf
footprint MSOP-8-1EP_3x3mm_P0.65mm_EP2.5x3mm_Mask1.73x2.36mm_ThermalVias
pins: 1 VIN (power), 2 GND (power), 3 NC (in) hidden, 4 EN2 (in), 5 EN1 (in), 6 NC (in) hidden, 7 VOUT2 (power), 8 VOUT1 (power), 9 GND hidden

## MIC5356-SCYMME
designator *  value MIC5356-SCYMME
ki_keywords: Dual LDO 500mA MSOP-8; ki_description: Dual 500mA μCap Low Dropout Micropower Linear Regulator, 3.3V/1.0V, MSOP-8; ki_fp_filters: MSOP*1EP*3x3mm*P0.65mm*; Footprint: Package_SO:MSOP-8-1EP_3x3mm_P0.65mm_EP2.5x3mm_Mask1.73x2.36mm_ThermalVias; Supplier: http://ww1.microchip.com/downloads/en/DeviceDoc/mic5355_6.pdf
footprint MSOP-8-1EP_3x3mm_P0.65mm_EP2.5x3mm_Mask1.73x2.36mm_ThermalVias
pins: 1 VIN (power), 2 GND (power), 3 NC (in) hidden, 4 EN2 (in), 5 EN1 (in), 6 NC (in) hidden, 7 VOUT2 (power), 8 VOUT1 (power), 9 GND hidden

## MIC5356-SGYMME
designator *  value MIC5356-SGYMME
ki_keywords: Dual LDO 500mA MSOP-8; ki_description: Dual 500mA μCap Low Dropout Micropower Linear Regulator, 3.3V/1.8V, MSOP-8; ki_fp_filters: MSOP*1EP*3x3mm*P0.65mm*; Footprint: Package_SO:MSOP-8-1EP_3x3mm_P0.65mm_EP2.5x3mm_Mask1.73x2.36mm_ThermalVias; Supplier: http://ww1.microchip.com/downloads/en/DeviceDoc/mic5355_6.pdf
footprint MSOP-8-1EP_3x3mm_P0.65mm_EP2.5x3mm_Mask1.73x2.36mm_ThermalVias
pins: 1 VIN (power), 2 GND (power), 3 NC (in) hidden, 4 EN2 (in), 5 EN1 (in), 6 NC (in) hidden, 7 VOUT2 (power), 8 VOUT1 (power), 9 GND hidden

## MIC5365-3.3YC5
designator *  value MIC5365-3.3YC5
ki_keywords: Micrel LDO voltage regulator; ki_description: 150mA Low-dropout Voltage Regulator, Vout 3.3V, Vin up to 5.5V, SC-70-5; ki_fp_filters: SOT*353*SC*70*; Footprint: Package_TO_SOT_SMD:SOT-353_SC-70-5; Supplier: http://ww1.microchip.com/downloads/en/DeviceDoc/mic5365.pdf
footprint SOT-353_SC-70-5
pins: 1 VIN (power), 2 GND (power), 3 EN (in), 4 NC (in) hidden, 5 VOUT (power)

## MIC5365-3.3YD5
designator *  value MIC5365-3.3YD5
ki_keywords: Micrel LDO voltage regulator; ki_description: 150mA Low-dropout Voltage Regulator, Vout 3.3V, Vin up to 5.5V, SOT-23-5; ki_fp_filters: SOT?23*; Footprint: Package_TO_SOT_SMD:SOT-23-5; Supplier: http://ww1.microchip.com/downloads/en/DeviceDoc/mic5365.pdf
footprint SOT-23-5
pins: 1 VIN (power), 2 GND (power), 3 EN (in), 4 NC (in) hidden, 5 VOUT (power)
